# Altium footprint library con-samtec.PCBLIB: 805 footprints (part 53 of 55)
Each footprint in its own frame and in the unit in brackets; x right, y up, seen from the top. Pads: shape width x height; smd on the part's side, far side on the other; paste and mask are expansions set on the pad; w line width, h text height; cw(c..) or ccw(c..) is an arc to the next point about the centre after c.
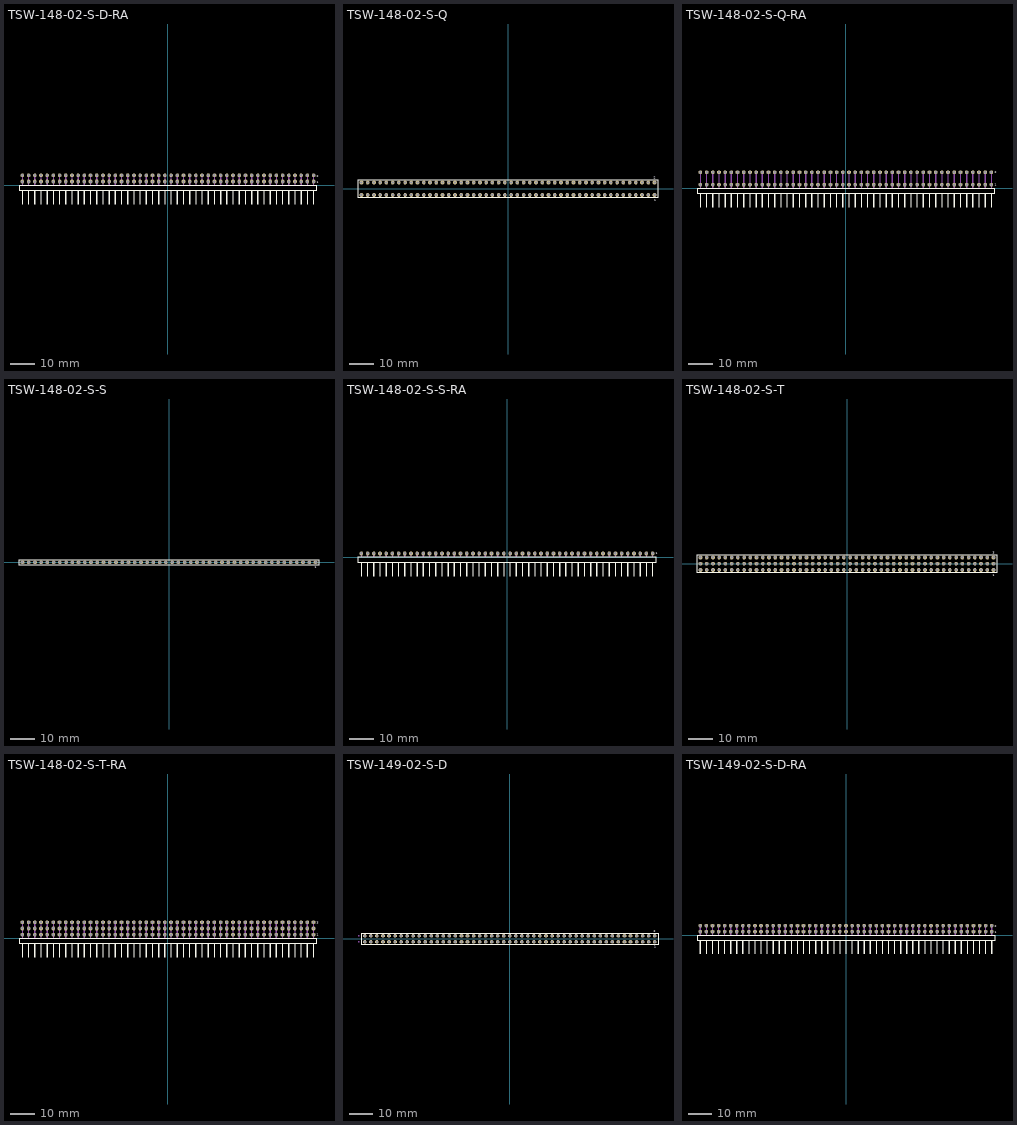
[diagram p52: the footprints below, top view; thin cyan lines are the x and y axes]

## TSW-148-02-S-D-RA [mil]
pads (96):
  oct 59.06x59.06 hole 39.37: 1(2350,60) 2(2350,160) 3(2250,60) 4(2250,160) 5(2150,60) 6(2150,160) 7(2050,60) 8(2050,160) 9(1950,60) 10(1950,160) 11(1850,60) 12(1850,160) 13(1750,60) 14(1750,160) 15(1650,60) 16(1650,160) 17(1550,60) 18(1550,160) 19(1450,60) 20(1450,160) 21(1350,60) 22(1350,160) 23(1250,60) 24(1250,160) 25(1150,60) 26(1150,160) 27(1050,60) 28(1050,160) 29(950,60) 30(950,160) 31(850,60) 32(850,160) 33(750,60) 34(750,160) 35(650,60) 36(650,160) 37(550,60) 38(550,160) 39(450,60) 40(450,160) 41(350,60) 42(350,160) 43(250,60) 44(250,160) 45(150,60) 46(150,160) 47(50,60) 48(50,160) 49(-50,60) 50(-50,160) 51(-150,60) 52(-150,160) 53(-250,60) 54(-250,160) 55(-350,60) 56(-350,160) 57(-450,60) 58(-450,160) 59(-550,60) 60(-550,160) 61(-650,60) 62(-650,160) 63(-750,60) 64(-750,160) 65(-850,60) 66(-850,160) 67(-950,60) 68(-950,160) 69(-1050,60) 70(-1050,160) 71(-1150,60) 72(-1150,160) 73(-1250,60) 74(-1250,160) 75(-1350,60) 76(-1350,160) 77(-1450,60) 78(-1450,160) 79(-1550,60) 80(-1550,160) 81(-1650,60) 82(-1650,160) 83(-1750,60) 84(-1750,160) 85(-1850,60) 86(-1850,160) 87(-1950,60) 88(-1950,160) 89(-2050,60) 90(-2050,160) 91(-2150,60) 92(-2150,160) 93(-2250,60) 94(-2250,160) 95(-2350,60) 96(-2350,160)
Top Overlay:
  rectangle: -2360,-310.63 -2340,-80.32
  rectangle: -2260,-310.63 -2240,-80.32
  rectangle: -2160,-310.63 -2140,-80.32
  rectangle: -2060,-310.63 -2040,-80.32
  rectangle: -1960,-310.63 -1940,-80.32
  rectangle: -1860,-310.63 -1840,-80.32
  rectangle: -1760,-310.63 -1740,-80.32
  rectangle: -1660,-310.63 -1640,-80.32
  rectangle: -1560,-310.63 -1540,-80.32
  rectangle: -1460,-310.63 -1440,-80.32
  rectangle: -1360,-310.63 -1340,-80.32
  rectangle: -1260,-310.63 -1240,-80.32
  rectangle: -1160,-310.63 -1140,-80.32
  rectangle: -1060,-310.63 -1040,-80.32
  rectangle: -960,-310.63 -940,-80.32
  rectangle: -860,-310.63 -840,-80.32
  rectangle: -760,-310.63 -740,-80.32
  rectangle: -660,-310.63 -640,-80.32
  rectangle: -560,-310.63 -540,-80.32
  rectangle: -460,-310.63 -440,-80.32
  rectangle: -360,-310.63 -340,-80.32
  rectangle: -260,-310.63 -240,-80.32
  rectangle: -160,-310.63 -140,-80.32
  rectangle: -60,-310.63 -40,-80.32
  rectangle: 40,-310.63 60,-80.32
  rectangle: 140,-310.63 160,-80.32
  rectangle: 240,-310.63 260,-80.32
  rectangle: 340,-310.63 360,-80.32
  rectangle: 440,-310.63 460,-80.32
  rectangle: 540,-310.63 560,-80.32
  rectangle: 640,-310.63 660,-80.32
  rectangle: 740,-310.63 760,-80.32
  rectangle: 840,-310.63 860,-80.32
  rectangle: 940,-310.63 960,-80.32
  rectangle: 1040,-310.63 1060,-80.32
  rectangle: 1140,-310.63 1160,-80.32
  rectangle: 1240,-310.63 1260,-80.32
  rectangle: 1340,-310.63 1360,-80.32
  rectangle: 1440,-310.63 1460,-80.32
  rectangle: 1540,-310.63 1560,-80.32
  rectangle: 1640,-310.63 1660,-80.32
  rectangle: 1740,-310.63 1760,-80.32
  rectangle: 1840,-310.63 1860,-80.32
  rectangle: 1940,-310.63 1960,-80.32
  rectangle: 2040,-310.63 2060,-80.32
  rectangle: 2140,-310.63 2160,-80.32
  rectangle: 2240,-310.63 2260,-80.32
  rectangle: 2340,-310.63 2360,-80.32
  lines w8: -2405.08,-80.55 2405.08,-80.55 2405.08,-4.17 -2405.08,-4.17 -2405.08,-80.55
  text "1" at 2400.59,30.51 h36.81
  text "2" at 2399.21,129.53 h36.81
Mechanical 16:
  rectangle: -2360,0 -2340,170
  rectangle: -2260,0 -2240,170
  rectangle: -2160,0 -2140,170
  rectangle: -2060,0 -2040,170
  rectangle: -1960,0 -1940,170
  rectangle: -1860,0 -1840,170
  rectangle: -1760,0 -1740,170
  rectangle: -1660,0 -1640,170
  rectangle: -1560,0 -1540,170
  rectangle: -1460,0 -1440,170
  rectangle: -1360,0 -1340,170
  rectangle: -1260,0 -1240,170
  rectangle: -1160,0 -1140,170
  rectangle: -1060,0 -1040,170
  rectangle: -960,0 -940,170
  rectangle: -860,0 -840,170
  rectangle: -760,0 -740,170
  rectangle: -660,0 -640,170
  rectangle: -560,0 -540,170
  rectangle: -460,0 -440,170
  rectangle: -360,0 -340,170
  rectangle: -260,0 -240,170
  rectangle: -160,0 -140,170
  rectangle: -60,0 -40,170
  rectangle: 40,0 60,170
  rectangle: 140,0 160,170
  rectangle: 240,0 260,170
  rectangle: 340,0 360,170
  rectangle: 440,0 460,170
  rectangle: 540,0 560,170
  rectangle: 640,0 660,170
  rectangle: 740,0 760,170
  rectangle: 840,0 860,170
  rectangle: 940,0 960,170
  rectangle: 1040,0 1060,170
  rectangle: 1140,0 1160,170
  rectangle: 1240,0 1260,170
  rectangle: 1340,0 1360,170
  rectangle: 1440,0 1460,170
  rectangle: 1540,0 1560,170
  rectangle: 1640,0 1660,170
  rectangle: 1740,0 1760,170
  rectangle: 1840,0 1860,170
  rectangle: 1940,0 1960,170
  rectangle: 2040,0 2060,170
  rectangle: 2140,0 2160,170
  rectangle: 2240,0 2260,170
  rectangle: 2340,0 2360,170

## TSW-148-02-S-Q [mm]
pads (96):
  oct 1.5x1.5 hole 1: 1(59.69,-2.54) 2(59.69,2.54) 3(57.15,-2.54) 4(57.15,2.54) 5(54.61,-2.54) 6(54.61,2.54) 7(52.07,-2.54) 8(52.07,2.54) 9(49.53,-2.54) 10(49.53,2.54) 11(46.99,-2.54) 12(46.99,2.54) 13(44.45,-2.54) 14(44.45,2.54) 15(41.91,-2.54) 16(41.91,2.54) 17(39.37,-2.54) 18(39.37,2.54) 19(36.83,-2.54) 20(36.83,2.54) 21(34.29,-2.54) 22(34.29,2.54) 23(31.75,-2.54) 24(31.75,2.54) 25(29.21,-2.54) 26(29.21,2.54) 27(26.67,-2.54) 28(26.67,2.54) 29(24.13,-2.54) 30(24.13,2.54) 31(21.59,-2.54) 32(21.59,2.54) 33(19.05,-2.54) 34(19.05,2.54) 35(16.51,-2.54) 36(16.51,2.54) 37(13.97,-2.54) 38(13.97,2.54) 39(11.43,-2.54) 40(11.43,2.54) 41(8.89,-2.54) 42(8.89,2.54) 43(6.35,-2.54) 44(6.35,2.54) 45(3.81,-2.54) 46(3.81,2.54) 47(1.27,-2.54) 48(1.27,2.54) 49(-1.27,-2.54) 50(-1.27,2.54) 51(-3.81,-2.54) 52(-3.81,2.54) 53(-6.35,-2.54) 54(-6.35,2.54) 55(-8.89,-2.54) 56(-8.89,2.54) 57(-11.43,-2.54) 58(-11.43,2.54) 59(-13.97,-2.54) 60(-13.97,2.54) 61(-16.51,-2.54) 62(-16.51,2.54) 63(-19.05,-2.54) 64(-19.05,2.54) 65(-21.59,-2.54) 66(-21.59,2.54) 67(-24.13,-2.54) 68(-24.13,2.54) 69(-26.67,-2.54) 70(-26.67,2.54) 71(-29.21,-2.54) 72(-29.21,2.54) 73(-31.75,-2.54) 74(-31.75,2.54) 75(-34.29,-2.54) 76(-34.29,2.54) 77(-36.83,-2.54) 78(-36.83,2.54) 79(-39.37,-2.54) 80(-39.37,2.54) 81(-41.91,-2.54) 82(-41.91,2.54) 83(-44.45,-2.54) 84(-44.45,2.54) 85(-46.99,-2.54) 86(-46.99,2.54) 87(-49.53,-2.54) 88(-49.53,2.54) 89(-52.07,-2.54) 90(-52.07,2.54) 91(-54.61,-2.54) 92(-54.61,2.54) 93(-57.15,-2.54) 94(-57.15,2.54) 95(-59.69,-2.54) 96(-59.69,2.54)
Top Overlay:
  lines w0.203: -61.089,-3.695 61.089,-3.695 61.089,3.695 -61.089,3.695 -61.089,-3.695
  text "1" at 59.532,-5.138 h0.94
  text "2" at 59.432,3.989 h0.94
Mechanical 16:
  rectangle: -60.04,-2.89 -59.34,-2.19
  rectangle: -60.04,2.19 -59.34,2.89
  rectangle: -57.5,-2.89 -56.8,-2.19
  rectangle: -57.5,2.19 -56.8,2.89
  rectangle: -54.96,-2.89 -54.26,-2.19
  rectangle: -54.96,2.19 -54.26,2.89
  rectangle: -52.42,-2.89 -51.72,-2.19
  rectangle: -52.42,2.19 -51.72,2.89
  rectangle: -49.88,-2.89 -49.18,-2.19
  rectangle: -49.88,2.19 -49.18,2.89
  rectangle: -47.34,-2.89 -46.64,-2.19
  rectangle: -47.34,2.19 -46.64,2.89
  rectangle: -44.8,-2.89 -44.1,-2.19
  rectangle: -44.8,2.19 -44.1,2.89
  rectangle: -42.26,-2.89 -41.56,-2.19
  rectangle: -42.26,2.19 -41.56,2.89
  rectangle: -39.72,-2.89 -39.02,-2.19
  rectangle: -39.72,2.19 -39.02,2.89
  rectangle: -37.18,-2.89 -36.48,-2.19
  rectangle: -37.18,2.19 -36.48,2.89
  rectangle: -34.64,-2.89 -33.94,-2.19
  rectangle: -34.64,2.19 -33.94,2.89
  rectangle: -32.1,-2.89 -31.4,-2.19
  rectangle: -32.1,2.19 -31.4,2.89
  rectangle: -29.56,-2.89 -28.86,-2.19
  rectangle: -29.56,2.19 -28.86,2.89
  rectangle: -27.02,-2.89 -26.32,-2.19
  rectangle: -27.02,2.19 -26.32,2.89
  rectangle: -24.48,-2.89 -23.78,-2.19
  rectangle: -24.48,2.19 -23.78,2.89
  rectangle: -21.94,-2.89 -21.24,-2.19
  rectangle: -21.94,2.19 -21.24,2.89
  rectangle: -19.4,-2.89 -18.7,-2.19
  rectangle: -19.4,2.19 -18.7,2.89
  rectangle: -16.86,-2.89 -16.16,-2.19
  rectangle: -16.86,2.19 -16.16,2.89
  rectangle: -14.32,-2.89 -13.62,-2.19
  rectangle: -14.32,2.19 -13.62,2.89
  rectangle: -11.78,-2.89 -11.08,-2.19
  rectangle: -11.78,2.19 -11.08,2.89
  rectangle: -9.24,-2.89 -8.54,-2.19
  rectangle: -9.24,2.19 -8.54,2.89
  rectangle: -6.7,-2.89 -6,-2.19
  rectangle: -6.7,2.19 -6,2.89
  rectangle: -4.16,-2.89 -3.46,-2.19
  rectangle: -4.16,2.19 -3.46,2.89
  rectangle: -1.62,-2.89 -0.92,-2.19
  rectangle: -1.62,2.19 -0.92,2.89
  rectangle: 0.92,-2.89 1.62,-2.19
  rectangle: 0.92,2.19 1.62,2.89
  rectangle: 3.46,-2.89 4.16,-2.19
  rectangle: 3.46,2.19 4.16,2.89
  rectangle: 6,-2.89 6.7,-2.19
  rectangle: 6,2.19 6.7,2.89
  rectangle: 8.54,-2.89 9.24,-2.19
  rectangle: 8.54,2.19 9.24,2.89
  rectangle: 11.08,-2.89 11.78,-2.19
  rectangle: 11.08,2.19 11.78,2.89
  rectangle: 13.62,-2.89 14.32,-2.19
  rectangle: 13.62,2.19 14.32,2.89
  rectangle: 16.16,-2.89 16.86,-2.19
  rectangle: 16.16,2.19 16.86,2.89
  rectangle: 18.7,-2.89 19.4,-2.19
  rectangle: 18.7,2.19 19.4,2.89
  rectangle: 21.24,-2.89 21.94,-2.19
  rectangle: 21.24,2.19 21.94,2.89
  rectangle: 23.78,-2.89 24.48,-2.19
  rectangle: 23.78,2.19 24.48,2.89
  rectangle: 26.32,-2.89 27.02,-2.19
  rectangle: 26.32,2.19 27.02,2.89
  rectangle: 28.86,-2.89 29.56,-2.19
  rectangle: 28.86,2.19 29.56,2.89
  rectangle: 31.4,-2.89 32.1,-2.19
  rectangle: 31.4,2.19 32.1,2.89
  rectangle: 33.94,-2.89 34.64,-2.19
  rectangle: 33.94,2.19 34.64,2.89
  rectangle: 36.48,-2.89 37.18,-2.19
  rectangle: 36.48,2.19 37.18,2.89
  rectangle: 39.02,-2.89 39.72,-2.19
  rectangle: 39.02,2.19 39.72,2.89
  rectangle: 41.56,-2.89 42.26,-2.19
  rectangle: 41.56,2.19 42.26,2.89
  rectangle: 44.1,-2.89 44.8,-2.19
  rectangle: 44.1,2.19 44.8,2.89
  rectangle: 46.64,-2.89 47.34,-2.19
  rectangle: 46.64,2.19 47.34,2.89
  rectangle: 49.18,-2.89 49.88,-2.19
  rectangle: 49.18,2.19 49.88,2.89
  rectangle: 51.72,-2.89 52.42,-2.19
  rectangle: 51.72,2.19 52.42,2.89
  rectangle: 54.26,-2.89 54.96,-2.19
  rectangle: 54.26,2.19 54.96,2.89
  rectangle: 56.8,-2.89 57.5,-2.19
  rectangle: 56.8,2.19 57.5,2.89
  rectangle: 59.34,-2.89 60.04,-2.19
  rectangle: 59.34,2.19 60.04,2.89

## TSW-148-02-S-Q-RA [mil]
pads (96):
  oct 59.06x59.06 hole 39.37: 1(2350,60) 2(2350,260) 3(2250,60) 4(2250,260) 5(2150,60) 6(2150,260) 7(2050,60) 8(2050,260) 9(1950,60) 10(1950,260) 11(1850,60) 12(1850,260) 13(1750,60) 14(1750,260) 15(1650,60) 16(1650,260) 17(1550,60) 18(1550,260) 19(1450,60) 20(1450,260) 21(1350,60) 22(1350,260) 23(1250,60) 24(1250,260) 25(1150,60) 26(1150,260) 27(1050,60) 28(1050,260) 29(950,60) 30(950,260) 31(850,60) 32(850,260) 33(750,60) 34(750,260) 35(650,60) 36(650,260) 37(550,60) 38(550,260) 39(450,60) 40(450,260) 41(350,60) 42(350,260) 43(250,60) 44(250,260) 45(150,60) 46(150,260) 47(50,60) 48(50,260) 49(-50,60) 50(-50,260) 51(-150,60) 52(-150,260) 53(-250,60) 54(-250,260) 55(-350,60) 56(-350,260) 57(-450,60) 58(-450,260) 59(-550,60) 60(-550,260) 61(-650,60) 62(-650,260) 63(-750,60) 64(-750,260) 65(-850,60) 66(-850,260) 67(-950,60) 68(-950,260) 69(-1050,60) 70(-1050,260) 71(-1150,60) 72(-1150,260) 73(-1250,60) 74(-1250,260) 75(-1350,60) 76(-1350,260) 77(-1450,60) 78(-1450,260) 79(-1550,60) 80(-1550,260) 81(-1650,60) 82(-1650,260) 83(-1750,60) 84(-1750,260) 85(-1850,60) 86(-1850,260) 87(-1950,60) 88(-1950,260) 89(-2050,60) 90(-2050,260) 91(-2150,60) 92(-2150,260) 93(-2250,60) 94(-2250,260) 95(-2350,60) 96(-2350,260)
Top Overlay:
  rectangle: -2360,-310.63 -2340,-80.32
  rectangle: -2260,-310.63 -2240,-80.32
  rectangle: -2160,-310.63 -2140,-80.32
  rectangle: -2060,-310.63 -2040,-80.32
  rectangle: -1960,-310.63 -1940,-80.32
  rectangle: -1860,-310.63 -1840,-80.32
  rectangle: -1760,-310.63 -1740,-80.32
  rectangle: -1660,-310.63 -1640,-80.32
  rectangle: -1560,-310.63 -1540,-80.32
  rectangle: -1460,-310.63 -1440,-80.32
  rectangle: -1360,-310.63 -1340,-80.32
  rectangle: -1260,-310.63 -1240,-80.32
  rectangle: -1160,-310.63 -1140,-80.32
  rectangle: -1060,-310.63 -1040,-80.32
  rectangle: -960,-310.63 -940,-80.32
  rectangle: -860,-310.63 -840,-80.32
  rectangle: -760,-310.63 -740,-80.32
  rectangle: -660,-310.63 -640,-80.32
  rectangle: -560,-310.63 -540,-80.32
  rectangle: -460,-310.63 -440,-80.32
  rectangle: -360,-310.63 -340,-80.32
  rectangle: -260,-310.63 -240,-80.32
  rectangle: -160,-310.63 -140,-80.32
  rectangle: -60,-310.63 -40,-80.32
  rectangle: 40,-310.63 60,-80.32
  rectangle: 140,-310.63 160,-80.32
  rectangle: 240,-310.63 260,-80.32
  rectangle: 340,-310.63 360,-80.32
  rectangle: 440,-310.63 460,-80.32
  rectangle: 540,-310.63 560,-80.32
  rectangle: 640,-310.63 660,-80.32
  rectangle: 740,-310.63 760,-80.32
  rectangle: 840,-310.63 860,-80.32
  rectangle: 940,-310.63 960,-80.32
  rectangle: 1040,-310.63 1060,-80.32
  rectangle: 1140,-310.63 1160,-80.32
  rectangle: 1240,-310.63 1260,-80.32
  rectangle: 1340,-310.63 1360,-80.32
  rectangle: 1440,-310.63 1460,-80.32
  rectangle: 1540,-310.63 1560,-80.32
  rectangle: 1640,-310.63 1660,-80.32
  rectangle: 1740,-310.63 1760,-80.32
  rectangle: 1840,-310.63 1860,-80.32
  rectangle: 1940,-310.63 1960,-80.32
  rectangle: 2040,-310.63 2060,-80.32
  rectangle: 2140,-310.63 2160,-80.32
  rectangle: 2240,-310.63 2260,-80.32
  rectangle: 2340,-310.63 2360,-80.32
  lines w8: -2405.08,-80.55 2405.08,-80.55 2405.08,-4.17 -2405.08,-4.17 -2405.08,-80.55
  text "1" at 2403.54,43.31 h36.81
  text "2" at 2401.18,242.72 h36.81
Mechanical 16:
  rectangle: -2360,0 -2340,270
  rectangle: -2260,0 -2240,270
  rectangle: -2160,0 -2140,270
  rectangle: -2060,0 -2040,270
  rectangle: -1960,0 -1940,270
  rectangle: -1860,0 -1840,270
  rectangle: -1760,0 -1740,270
  rectangle: -1660,0 -1640,270
  rectangle: -1560,0 -1540,270
  rectangle: -1460,0 -1440,270
  rectangle: -1360,0 -1340,270
  rectangle: -1260,0 -1240,270
  rectangle: -1160,0 -1140,270
  rectangle: -1060,0 -1040,270
  rectangle: -960,0 -940,270
  rectangle: -860,0 -840,270
  rectangle: -760,0 -740,270
  rectangle: -660,0 -640,270
  rectangle: -560,0 -540,270
  rectangle: -460,0 -440,270
  rectangle: -360,0 -340,270
  rectangle: -260,0 -240,270
  rectangle: -160,0 -140,270
  rectangle: -60,0 -40,270
  rectangle: 40,0 60,270
  rectangle: 140,0 160,270
  rectangle: 240,0 260,270
  rectangle: 340,0 360,270
  rectangle: 440,0 460,270
  rectangle: 540,0 560,270
  rectangle: 640,0 660,270
  rectangle: 740,0 760,270
  rectangle: 840,0 860,270
  rectangle: 940,0 960,270
  rectangle: 1040,0 1060,270
  rectangle: 1140,0 1160,270
  rectangle: 1240,0 1260,270
  rectangle: 1340,0 1360,270
  rectangle: 1440,0 1460,270
  rectangle: 1540,0 1560,270
  rectangle: 1640,0 1660,270
  rectangle: 1740,0 1760,270
  rectangle: 1840,0 1860,270
  rectangle: 1940,0 1960,270
  rectangle: 2040,0 2060,270
  rectangle: 2140,0 2160,270
  rectangle: 2240,0 2260,270
  rectangle: 2340,0 2360,270

## TSW-148-02-S-S [mm]
pads (48):
  oct 1.5x1.5 hole 1: 1(59.69,0) 2(57.15,0) 3(54.61,0) 4(52.07,0) 5(49.53,0) 6(46.99,0) 7(44.45,0) 8(41.91,0) 9(39.37,0) 10(36.83,0) 11(34.29,0) 12(31.75,0) 13(29.21,0) 14(26.67,0) 15(24.13,0) 16(21.59,0) 17(19.05,0) 18(16.51,0) 19(13.97,0) 20(11.43,0) 21(8.89,0) 22(6.35,0) 23(3.81,0) 24(1.27,0) 25(-1.27,0) 26(-3.81,0) 27(-6.35,0) 28(-8.89,0) 29(-11.43,0) 30(-13.97,0) 31(-16.51,0) 32(-19.05,0) 33(-21.59,0) 34(-24.13,0) 35(-26.67,0) 36(-29.21,0) 37(-31.75,0) 38(-34.29,0) 39(-36.83,0) 40(-39.37,0) 41(-41.91,0) 42(-44.45,0) 43(-46.99,0) 44(-49.53,0) 45(-52.07,0) 46(-54.61,0) 47(-57.15,0) 48(-59.69,0)
Top Overlay:
  lines w0.203: -61.089,-1.155 61.089,-1.155 61.089,1.155 -61.089,1.155 -61.089,-1.155
  text "1" at 59.432,-2.498 h0.94
Mechanical 16:
  rectangle: -60.04,-0.35 -59.34,0.35
  rectangle: -57.5,-0.35 -56.8,0.35
  rectangle: -54.96,-0.35 -54.26,0.35
  rectangle: -52.42,-0.35 -51.72,0.35
  rectangle: -49.88,-0.35 -49.18,0.35
  rectangle: -47.34,-0.35 -46.64,0.35
  rectangle: -44.8,-0.35 -44.1,0.35
  rectangle: -42.26,-0.35 -41.56,0.35
  rectangle: -39.72,-0.35 -39.02,0.35
  rectangle: -37.18,-0.35 -36.48,0.35
  rectangle: -34.64,-0.35 -33.94,0.35
  rectangle: -32.1,-0.35 -31.4,0.35
  rectangle: -29.56,-0.35 -28.86,0.35
  rectangle: -27.02,-0.35 -26.32,0.35
  rectangle: -24.48,-0.35 -23.78,0.35
  rectangle: -21.94,-0.35 -21.24,0.35
  rectangle: -19.4,-0.35 -18.7,0.35
  rectangle: -16.86,-0.35 -16.16,0.35
  rectangle: -14.32,-0.35 -13.62,0.35
  rectangle: -11.78,-0.35 -11.08,0.35
  rectangle: -9.24,-0.35 -8.54,0.35
  rectangle: -6.7,-0.35 -6,0.35
  rectangle: -4.16,-0.35 -3.46,0.35
  rectangle: -1.62,-0.35 -0.92,0.35
  rectangle: 0.92,-0.35 1.62,0.35
  rectangle: 3.46,-0.35 4.16,0.35
  rectangle: 6,-0.35 6.7,0.35
  rectangle: 8.54,-0.35 9.24,0.35
  rectangle: 11.08,-0.35 11.78,0.35
  rectangle: 13.62,-0.35 14.32,0.35
  rectangle: 16.16,-0.35 16.86,0.35
  rectangle: 18.7,-0.35 19.4,0.35
  rectangle: 21.24,-0.35 21.94,0.35
  rectangle: 23.78,-0.35 24.48,0.35
  rectangle: 26.32,-0.35 27.02,0.35
  rectangle: 28.86,-0.35 29.56,0.35
  rectangle: 31.4,-0.35 32.1,0.35
  rectangle: 33.94,-0.35 34.64,0.35
  rectangle: 36.48,-0.35 37.18,0.35
  rectangle: 39.02,-0.35 39.72,0.35
  rectangle: 41.56,-0.35 42.26,0.35
  rectangle: 44.1,-0.35 44.8,0.35
  rectangle: 46.64,-0.35 47.34,0.35
  rectangle: 49.18,-0.35 49.88,0.35
  rectangle: 51.72,-0.35 52.42,0.35
  rectangle: 54.26,-0.35 54.96,0.35
  rectangle: 56.8,-0.35 57.5,0.35
  rectangle: 59.34,-0.35 60.04,0.35

## TSW-148-02-S-S-RA [mil]
pads (48):
  oct 59.06x59.06 hole 39.37: 1(2350,60) 2(2250,60) 3(2150,60) 4(2050,60) 5(1950,60) 6(1850,60) 7(1750,60) 8(1650,60) 9(1550,60) 10(1450,60) 11(1350,60) 12(1250,60) 13(1150,60) 14(1050,60) 15(950,60) 16(850,60) 17(750,60) 18(650,60) 19(550,60) 20(450,60) 21(350,60) 22(250,60) 23(150,60) 24(50,60) 25(-50,60) 26(-150,60) 27(-250,60) 28(-350,60) 29(-450,60) 30(-550,60) 31(-650,60) 32(-750,60) 33(-850,60) 34(-950,60) 35(-1050,60) 36(-1150,60) 37(-1250,60) 38(-1350,60) 39(-1450,60) 40(-1550,60) 41(-1650,60) 42(-1750,60) 43(-1850,60) 44(-1950,60) 45(-2050,60) 46(-2150,60) 47(-2250,60) 48(-2350,60)
Top Overlay:
  rectangle: -2360,-310.63 -2340,-80.32
  rectangle: -2260,-310.63 -2240,-80.32
  rectangle: -2160,-310.63 -2140,-80.32
  rectangle: -2060,-310.63 -2040,-80.32
  rectangle: -1960,-310.63 -1940,-80.32
  rectangle: -1860,-310.63 -1840,-80.32
  rectangle: -1760,-310.63 -1740,-80.32
  rectangle: -1660,-310.63 -1640,-80.32
  rectangle: -1560,-310.63 -1540,-80.32
  rectangle: -1460,-310.63 -1440,-80.32
  rectangle: -1360,-310.63 -1340,-80.32
  rectangle: -1260,-310.63 -1240,-80.32
  rectangle: -1160,-310.63 -1140,-80.32
  rectangle: -1060,-310.63 -1040,-80.32
  rectangle: -960,-310.63 -940,-80.32
  rectangle: -860,-310.63 -840,-80.32
  rectangle: -760,-310.63 -740,-80.32
  rectangle: -660,-310.63 -640,-80.32
  rectangle: -560,-310.63 -540,-80.32
  rectangle: -460,-310.63 -440,-80.32
  rectangle: -360,-310.63 -340,-80.32
  rectangle: -260,-310.63 -240,-80.32
  rectangle: -160,-310.63 -140,-80.32
  rectangle: -60,-310.63 -40,-80.32
  rectangle: 40,-310.63 60,-80.32
  rectangle: 140,-310.63 160,-80.32
  rectangle: 240,-310.63 260,-80.32
  rectangle: 340,-310.63 360,-80.32
  rectangle: 440,-310.63 460,-80.32
  rectangle: 540,-310.63 560,-80.32
  rectangle: 640,-310.63 660,-80.32
  rectangle: 740,-310.63 760,-80.32
  rectangle: 840,-310.63 860,-80.32
  rectangle: 940,-310.63 960,-80.32
  rectangle: 1040,-310.63 1060,-80.32
  rectangle: 1140,-310.63 1160,-80.32
  rectangle: 1240,-310.63 1260,-80.32
  rectangle: 1340,-310.63 1360,-80.32
  rectangle: 1440,-310.63 1460,-80.32
  rectangle: 1540,-310.63 1560,-80.32
  rectangle: 1640,-310.63 1660,-80.32
  rectangle: 1740,-310.63 1760,-80.32
  rectangle: 1840,-310.63 1860,-80.32
  rectangle: 1940,-310.63 1960,-80.32
  rectangle: 2040,-310.63 2060,-80.32
  rectangle: 2140,-310.63 2160,-80.32
  rectangle: 2240,-310.63 2260,-80.32
  rectangle: 2340,-310.63 2360,-80.32
  lines w8: -2405.08,-80.55 2405.08,-80.55 2405.08,-4.17 -2405.08,-4.17 -2405.08,-80.55
  text "1" at 2400.47,45.35 h36.81
Mechanical 16:
  rectangle: -2360,0 -2340,70
  rectangle: -2260,0 -2240,70
  rectangle: -2160,0 -2140,70
  rectangle: -2060,0 -2040,70
  rectangle: -1960,0 -1940,70
  rectangle: -1860,0 -1840,70
  rectangle: -1760,0 -1740,70
  rectangle: -1660,0 -1640,70
  rectangle: -1560,0 -1540,70
  rectangle: -1460,0 -1440,70
  rectangle: -1360,0 -1340,70
  rectangle: -1260,0 -1240,70
  rectangle: -1160,0 -1140,70
  rectangle: -1060,0 -1040,70
  rectangle: -960,0 -940,70
  rectangle: -860,0 -840,70
  rectangle: -760,0 -740,70
  rectangle: -660,0 -640,70
  rectangle: -560,0 -540,70
  rectangle: -460,0 -440,70
  rectangle: -360,0 -340,70
  rectangle: -260,0 -240,70
  rectangle: -160,0 -140,70
  rectangle: -60,0 -40,70
  rectangle: 40,0 60,70
  rectangle: 140,0 160,70
  rectangle: 240,0 260,70
  rectangle: 340,0 360,70
  rectangle: 440,0 460,70
  rectangle: 540,0 560,70
  rectangle: 640,0 660,70
  rectangle: 740,0 760,70
  rectangle: 840,0 860,70
  rectangle: 940,0 960,70
  rectangle: 1040,0 1060,70
  rectangle: 1140,0 1160,70
  rectangle: 1240,0 1260,70
  rectangle: 1340,0 1360,70
  rectangle: 1440,0 1460,70
  rectangle: 1540,0 1560,70
  rectangle: 1640,0 1660,70
  rectangle: 1740,0 1760,70
  rectangle: 1840,0 1860,70
  rectangle: 1940,0 1960,70
  rectangle: 2040,0 2060,70
  rectangle: 2140,0 2160,70
  rectangle: 2240,0 2260,70
  rectangle: 2340,0 2360,70

## TSW-148-02-S-T [mm]
pads (144):
  oct 1.5x1.5 hole 1: 1(59.69,-2.54) 2(59.69,0) 3(59.69,2.54) 4(57.15,-2.54) 5(57.15,0) 6(57.15,2.54) 7(54.61,-2.54) 8(54.61,0) 9(54.61,2.54) 10(52.07,-2.54) 11(52.07,0) 12(52.07,2.54) 13(49.53,-2.54) 14(49.53,0) 15(49.53,2.54) 16(46.99,-2.54) 17(46.99,0) 18(46.99,2.54) 19(44.45,-2.54) 20(44.45,0) 21(44.45,2.54) 22(41.91,-2.54) 23(41.91,0) 24(41.91,2.54) 25(39.37,-2.54) 26(39.37,0) 27(39.37,2.54) 28(36.83,-2.54) 29(36.83,0) 30(36.83,2.54) 31(34.29,-2.54) 32(34.29,0) 33(34.29,2.54) 34(31.75,-2.54) 35(31.75,0) 36(31.75,2.54) 37(29.21,-2.54) 38(29.21,0) 39(29.21,2.54) 40(26.67,-2.54) 41(26.67,0) 42(26.67,2.54) 43(24.13,-2.54) 44(24.13,0) 45(24.13,2.54) 46(21.59,-2.54) 47(21.59,0) 48(21.59,2.54) 49(19.05,-2.54) 50(19.05,0) 51(19.05,2.54) 52(16.51,-2.54) 53(16.51,0) 54(16.51,2.54) 55(13.97,-2.54) 56(13.97,0) 57(13.97,2.54) 58(11.43,-2.54) 59(11.43,0) 60(11.43,2.54) 61(8.89,-2.54) 62(8.89,0) 63(8.89,2.54) 64(6.35,-2.54) 65(6.35,0) 66(6.35,2.54) 67(3.81,-2.54) 68(3.81,0) 69(3.81,2.54) 70(1.27,-2.54) 71(1.27,0) 72(1.27,2.54) 73(-1.27,-2.54) 74(-1.27,0) 75(-1.27,2.54) 76(-3.81,-2.54) 77(-3.81,0) 78(-3.81,2.54) 79(-6.35,-2.54) 80(-6.35,0) 81(-6.35,2.54) 82(-8.89,-2.54) 83(-8.89,0) 84(-8.89,2.54) 85(-11.43,-2.54) 86(-11.43,0) 87(-11.43,2.54) 88(-13.97,-2.54) 89(-13.97,0) 90(-13.97,2.54) 91(-16.51,-2.54) 92(-16.51,0) 93(-16.51,2.54) 94(-19.05,-2.54) 95(-19.05,0) 96(-19.05,2.54) 97(-21.59,-2.54) 98(-21.59,0) 99(-21.59,2.54) 100(-24.13,-2.54) 101(-24.13,0) 102(-24.13,2.54) 103(-26.67,-2.54) 104(-26.67,0) 105(-26.67,2.54) 106(-29.21,-2.54) 107(-29.21,0) 108(-29.21,2.54) 109(-31.75,-2.54) 110(-31.75,0) 111(-31.75,2.54) 112(-34.29,-2.54) 113(-34.29,0) 114(-34.29,2.54) 115(-36.83,-2.54) 116(-36.83,0) 117(-36.83,2.54) 118(-39.37,-2.54) 119(-39.37,0) 120(-39.37,2.54) 121(-41.91,-2.54) 122(-41.91,0) 123(-41.91,2.54) 124(-44.45,-2.54) 125(-44.45,0) 126(-44.45,2.54) 127(-46.99,-2.54) 128(-46.99,0) 129(-46.99,2.54) 130(-49.53,-2.54) 131(-49.53,0) 132(-49.53,2.54) 133(-52.07,-2.54) 134(-52.07,0) 135(-52.07,2.54) 136(-54.61,-2.54) 137(-54.61,0) 138(-54.61,2.54) 139(-57.15,-2.54) 140(-57.15,0) 141(-57.15,2.54) 142(-59.69,-2.54) 143(-59.69,0) 144(-59.69,2.54)
Top Overlay:
  lines w0.203: -61.089,-3.695 61.089,-3.695 61.089,3.695 -61.089,3.695 -61.089,-3.695
  text "1" at 59.382,-5.188 h0.94
  text "3" at 59.378,3.989 h0.94
Mechanical 16:
  rectangle: -60.04,-2.89 -59.34,-2.19
  rectangle: -60.04,-0.35 -59.34,0.35
  rectangle: -60.04,2.19 -59.34,2.89
  rectangle: -57.5,-2.89 -56.8,-2.19
  rectangle: -57.5,-0.35 -56.8,0.35
  rectangle: -57.5,2.19 -56.8,2.89
  rectangle: -54.96,-2.89 -54.26,-2.19
  rectangle: -54.96,-0.35 -54.26,0.35
  rectangle: -54.96,2.19 -54.26,2.89
  rectangle: -52.42,-2.89 -51.72,-2.19
  rectangle: -52.42,-0.35 -51.72,0.35
  rectangle: -52.42,2.19 -51.72,2.89
  rectangle: -49.88,-2.89 -49.18,-2.19
  rectangle: -49.88,-0.35 -49.18,0.35
  rectangle: -49.88,2.19 -49.18,2.89
  rectangle: -47.34,-2.89 -46.64,-2.19
  rectangle: -47.34,-0.35 -46.64,0.35
  rectangle: -47.34,2.19 -46.64,2.89
  rectangle: -44.8,-2.89 -44.1,-2.19
  rectangle: -44.8,-0.35 -44.1,0.35
  rectangle: -44.8,2.19 -44.1,2.89
  rectangle: -42.26,-2.89 -41.56,-2.19
  rectangle: -42.26,-0.35 -41.56,0.35
  rectangle: -42.26,2.19 -41.56,2.89
  rectangle: -39.72,-2.89 -39.02,-2.19
  rectangle: -39.72,-0.35 -39.02,0.35
  rectangle: -39.72,2.19 -39.02,2.89
  rectangle: -37.18,-2.89 -36.48,-2.19
  rectangle: -37.18,-0.35 -36.48,0.35
  rectangle: -37.18,2.19 -36.48,2.89
  rectangle: -34.64,-2.89 -33.94,-2.19
  rectangle: -34.64,-0.35 -33.94,0.35
  rectangle: -34.64,2.19 -33.94,2.89
  rectangle: -32.1,-2.89 -31.4,-2.19
  rectangle: -32.1,-0.35 -31.4,0.35
  rectangle: -32.1,2.19 -31.4,2.89
  rectangle: -29.56,-2.89 -28.86,-2.19
  rectangle: -29.56,-0.35 -28.86,0.35
  rectangle: -29.56,2.19 -28.86,2.89
  rectangle: -27.02,-2.89 -26.32,-2.19
  rectangle: -27.02,-0.35 -26.32,0.35
  rectangle: -27.02,2.19 -26.32,2.89
  rectangle: -24.48,-2.89 -23.78,-2.19
  rectangle: -24.48,-0.35 -23.78,0.35
  rectangle: -24.48,2.19 -23.78,2.89
  rectangle: -21.94,-2.89 -21.24,-2.19
  rectangle: -21.94,-0.35 -21.24,0.35
  rectangle: -21.94,2.19 -21.24,2.89
  rectangle: -19.4,-2.89 -18.7,-2.19
  rectangle: -19.4,-0.35 -18.7,0.35
  rectangle: -19.4,2.19 -18.7,2.89
  rectangle: -16.86,-2.89 -16.16,-2.19
  rectangle: -16.86,-0.35 -16.16,0.35
  rectangle: -16.86,2.19 -16.16,2.89
  rectangle: -14.32,-2.89 -13.62,-2.19
  rectangle: -14.32,-0.35 -13.62,0.35
  rectangle: -14.32,2.19 -13.62,2.89
  rectangle: -11.78,-2.89 -11.08,-2.19
  rectangle: -11.78,-0.35 -11.08,0.35
  rectangle: -11.78,2.19 -11.08,2.89
  rectangle: -9.24,-2.89 -8.54,-2.19
  rectangle: -9.24,-0.35 -8.54,0.35
  rectangle: -9.24,2.19 -8.54,2.89
  rectangle: -6.7,-2.89 -6,-2.19
  rectangle: -6.7,-0.35 -6,0.35
  rectangle: -6.7,2.19 -6,2.89
  rectangle: -4.16,-2.89 -3.46,-2.19
  rectangle: -4.16,-0.35 -3.46,0.35
  rectangle: -4.16,2.19 -3.46,2.89
  rectangle: -1.62,-2.89 -0.92,-2.19
  rectangle: -1.62,-0.35 -0.92,0.35
  rectangle: -1.62,2.19 -0.92,2.89
  rectangle: 0.92,-2.89 1.62,-2.19
  rectangle: 0.92,-0.35 1.62,0.35
  rectangle: 0.92,2.19 1.62,2.89
  rectangle: 3.46,-2.89 4.16,-2.19
  rectangle: 3.46,-0.35 4.16,0.35
  rectangle: 3.46,2.19 4.16,2.89
  rectangle: 6,-2.89 6.7,-2.19
  rectangle: 6,-0.35 6.7,0.35
  rectangle: 6,2.19 6.7,2.89
  rectangle: 8.54,-2.89 9.24,-2.19
  rectangle: 8.54,-0.35 9.24,0.35
  rectangle: 8.54,2.19 9.24,2.89
  rectangle: 11.08,-2.89 11.78,-2.19
  rectangle: 11.08,-0.35 11.78,0.35
  rectangle: 11.08,2.19 11.78,2.89
  rectangle: 13.62,-2.89 14.32,-2.19
  rectangle: 13.62,-0.35 14.32,0.35
  rectangle: 13.62,2.19 14.32,2.89
  rectangle: 16.16,-2.89 16.86,-2.19
  rectangle: 16.16,-0.35 16.86,0.35
  rectangle: 16.16,2.19 16.86,2.89
  rectangle: 18.7,-2.89 19.4,-2.19
  rectangle: 18.7,-0.35 19.4,0.35
  rectangle: 18.7,2.19 19.4,2.89
  rectangle: 21.24,-2.89 21.94,-2.19
  rectangle: 21.24,-0.35 21.94,0.35
  rectangle: 21.24,2.19 21.94,2.89
  rectangle: 23.78,-2.89 24.48,-2.19
  rectangle: 23.78,-0.35 24.48,0.35
  rectangle: 23.78,2.19 24.48,2.89
  rectangle: 26.32,-2.89 27.02,-2.19
  rectangle: 26.32,-0.35 27.02,0.35
  rectangle: 26.32,2.19 27.02,2.89
  rectangle: 28.86,-2.89 29.56,-2.19
  rectangle: 28.86,-0.35 29.56,0.35
  rectangle: 28.86,2.19 29.56,2.89
  rectangle: 31.4,-2.89 32.1,-2.19
  rectangle: 31.4,-0.35 32.1,0.35
  rectangle: 31.4,2.19 32.1,2.89
  rectangle: 33.94,-2.89 34.64,-2.19
  rectangle: 33.94,-0.35 34.64,0.35
  rectangle: 33.94,2.19 34.64,2.89
  rectangle: 36.48,-2.89 37.18,-2.19
  rectangle: 36.48,-0.35 37.18,0.35
  rectangle: 36.48,2.19 37.18,2.89
  rectangle: 39.02,-2.89 39.72,-2.19
  rectangle: 39.02,-0.35 39.72,0.35
  rectangle: 39.02,2.19 39.72,2.89
  rectangle: 41.56,-2.89 42.26,-2.19
  rectangle: 41.56,-0.35 42.26,0.35
  rectangle: 41.56,2.19 42.26,2.89
  rectangle: 44.1,-2.89 44.8,-2.19
  rectangle: 44.1,-0.35 44.8,0.35
  rectangle: 44.1,2.19 44.8,2.89
  rectangle: 46.64,-2.89 47.34,-2.19
  rectangle: 46.64,-0.35 47.34,0.35
  rectangle: 46.64,2.19 47.34,2.89
  rectangle: 49.18,-2.89 49.88,-2.19
  rectangle: 49.18,-0.35 49.88,0.35
  rectangle: 49.18,2.19 49.88,2.89
  rectangle: 51.72,-2.89 52.42,-2.19
  rectangle: 51.72,-0.35 52.42,0.35
  rectangle: 51.72,2.19 52.42,2.89
  rectangle: 54.26,-2.89 54.96,-2.19
  rectangle: 54.26,-0.35 54.96,0.35
  rectangle: 54.26,2.19 54.96,2.89
  rectangle: 56.8,-2.89 57.5,-2.19
  rectangle: 56.8,-0.35 57.5,0.35
  rectangle: 56.8,2.19 57.5,2.89
  rectangle: 59.34,-2.89 60.04,-2.19
  rectangle: 59.34,-0.35 60.04,0.35
  rectangle: 59.34,2.19 60.04,2.89

## TSW-148-02-S-T-RA [mil]
pads (144):
  oct 59.06x59.06 hole 39.37: 1(2350,60) 2(2350,160) 3(2350,260) 4(2250,60) 5(2250,160) 6(2250,260) 7(2150,60) 8(2150,160) 9(2150,260) 10(2050,60) 11(2050,160) 12(2050,260) 13(1950,60) 14(1950,160) 15(1950,260) 16(1850,60) 17(1850,160) 18(1850,260) 19(1750,60) 20(1750,160) 21(1750,260) 22(1650,60) 23(1650,160) 24(1650,260) 25(1550,60) 26(1550,160) 27(1550,260) 28(1450,60) 29(1450,160) 30(1450,260) 31(1350,60) 32(1350,160) 33(1350,260) 34(1250,60) 35(1250,160) 36(1250,260) 37(1150,60) 38(1150,160) 39(1150,260) 40(1050,60) 41(1050,160) 42(1050,260) 43(950,60) 44(950,160) 45(950,260) 46(850,60) 47(850,160) 48(850,260) 49(750,60) 50(750,160) 51(750,260) 52(650,60) 53(650,160) 54(650,260) 55(550,60) 56(550,160) 57(550,260) 58(450,60) 59(450,160) 60(450,260) 61(350,60) 62(350,160) 63(350,260) 64(250,60) 65(250,160) 66(250,260) 67(150,60) 68(150,160) 69(150,260) 70(50,60) 71(50,160) 72(50,260) 73(-50,60) 74(-50,160) 75(-50,260) 76(-150,60) 77(-150,160) 78(-150,260) 79(-250,60) 80(-250,160) 81(-250,260) 82(-350,60) 83(-350,160) 84(-350,260) 85(-450,60) 86(-450,160) 87(-450,260) 88(-550,60) 89(-550,160) 90(-550,260) 91(-650,60) 92(-650,160) 93(-650,260) 94(-750,60) 95(-750,160) 96(-750,260) 97(-850,60) 98(-850,160) 99(-850,260) 100(-950,60) 101(-950,160) 102(-950,260) 103(-1050,60) 104(-1050,160) 105(-1050,260) 106(-1150,60) 107(-1150,160) 108(-1150,260) 109(-1250,60) 110(-1250,160) 111(-1250,260) 112(-1350,60) 113(-1350,160) 114(-1350,260) 115(-1450,60) 116(-1450,160) 117(-1450,260) 118(-1550,60) 119(-1550,160) 120(-1550,260) 121(-1650,60) 122(-1650,160) 123(-1650,260) 124(-1750,60) 125(-1750,160) 126(-1750,260) 127(-1850,60) 128(-1850,160) 129(-1850,260) 130(-1950,60) 131(-1950,160) 132(-1950,260) 133(-2050,60) 134(-2050,160) 135(-2050,260) 136(-2150,60) 137(-2150,160) 138(-2150,260) 139(-2250,60) 140(-2250,160) 141(-2250,260) 142(-2350,60) 143(-2350,160) 144(-2350,260)
Top Overlay:
  rectangle: -2360,-310.63 -2340,-80.32
  rectangle: -2260,-310.63 -2240,-80.32
  rectangle: -2160,-310.63 -2140,-80.32
  rectangle: -2060,-310.63 -2040,-80.32
  rectangle: -1960,-310.63 -1940,-80.32
  rectangle: -1860,-310.63 -1840,-80.32
  rectangle: -1760,-310.63 -1740,-80.32
  rectangle: -1660,-310.63 -1640,-80.32
  rectangle: -1560,-310.63 -1540,-80.32
  rectangle: -1460,-310.63 -1440,-80.32
  rectangle: -1360,-310.63 -1340,-80.32
  rectangle: -1260,-310.63 -1240,-80.32
  rectangle: -1160,-310.63 -1140,-80.32
  rectangle: -1060,-310.63 -1040,-80.32
  rectangle: -960,-310.63 -940,-80.32
  rectangle: -860,-310.63 -840,-80.32
  rectangle: -760,-310.63 -740,-80.32
  rectangle: -660,-310.63 -640,-80.32
  rectangle: -560,-310.63 -540,-80.32
  rectangle: -460,-310.63 -440,-80.32
  rectangle: -360,-310.63 -340,-80.32
  rectangle: -260,-310.63 -240,-80.32
  rectangle: -160,-310.63 -140,-80.32
  rectangle: -60,-310.63 -40,-80.32
  rectangle: 40,-310.63 60,-80.32
  rectangle: 140,-310.63 160,-80.32
  rectangle: 240,-310.63 260,-80.32
  rectangle: 340,-310.63 360,-80.32
  rectangle: 440,-310.63 460,-80.32
  rectangle: 540,-310.63 560,-80.32
  rectangle: 640,-310.63 660,-80.32
  rectangle: 740,-310.63 760,-80.32
  rectangle: 840,-310.63 860,-80.32
  rectangle: 940,-310.63 960,-80.32
  rectangle: 1040,-310.63 1060,-80.32
  rectangle: 1140,-310.63 1160,-80.32
  rectangle: 1240,-310.63 1260,-80.32
  rectangle: 1340,-310.63 1360,-80.32
  rectangle: 1440,-310.63 1460,-80.32
  rectangle: 1540,-310.63 1560,-80.32
  rectangle: 1640,-310.63 1660,-80.32
  rectangle: 1740,-310.63 1760,-80.32
  rectangle: 1840,-310.63 1860,-80.32
  rectangle: 1940,-310.63 1960,-80.32
  rectangle: 2040,-310.63 2060,-80.32
  rectangle: 2140,-310.63 2160,-80.32
  rectangle: 2240,-310.63 2260,-80.32
  rectangle: 2340,-310.63 2360,-80.32
  lines w8: -2405.08,-80.55 2405.08,-80.55 2405.08,-4.17 -2405.08,-4.17 -2405.08,-80.55
  text "1" at 2401.57,41.34 h36.81
  text "3" at 2402.17,236.81 h36.81
Mechanical 16:
  rectangle: -2360,0 -2340,270
  rectangle: -2260,0 -2240,270
  rectangle: -2160,0 -2140,270
  rectangle: -2060,0 -2040,270
  rectangle: -1960,0 -1940,270
  rectangle: -1860,0 -1840,270
  rectangle: -1760,0 -1740,270
  rectangle: -1660,0 -1640,270
  rectangle: -1560,0 -1540,270
  rectangle: -1460,0 -1440,270
  rectangle: -1360,0 -1340,270
  rectangle: -1260,0 -1240,270
  rectangle: -1160,0 -1140,270
  rectangle: -1060,0 -1040,270
  rectangle: -960,0 -940,270
  rectangle: -860,0 -840,270
  rectangle: -760,0 -740,270
  rectangle: -660,0 -640,270
  rectangle: -560,0 -540,270
  rectangle: -460,0 -440,270
  rectangle: -360,0 -340,270
  rectangle: -260,0 -240,270
  rectangle: -160,0 -140,270
  rectangle: -60,0 -40,270
  rectangle: 40,0 60,270
  rectangle: 140,0 160,270
  rectangle: 240,0 260,270
  rectangle: 340,0 360,270
  rectangle: 440,0 460,270
  rectangle: 540,0 560,270
  rectangle: 640,0 660,270
  rectangle: 740,0 760,270
  rectangle: 840,0 860,270
  rectangle: 940,0 960,270
  rectangle: 1040,0 1060,270
  rectangle: 1140,0 1160,270
  rectangle: 1240,0 1260,270
  rectangle: 1340,0 1360,270
  rectangle: 1440,0 1460,270
  rectangle: 1540,0 1560,270
  rectangle: 1640,0 1660,270
  rectangle: 1740,0 1760,270
  rectangle: 1840,0 1860,270
  rectangle: 1940,0 1960,270
  rectangle: 2040,0 2060,270
  rectangle: 2140,0 2160,270
  rectangle: 2240,0 2260,270
  rectangle: 2340,0 2360,270

## TSW-149-02-S-D [mm]
pads (98):
  oct 1.5x1.5 hole 1: 1(60.96,-1.27) 2(60.96,1.27) 3(58.42,-1.27) 4(58.42,1.27) 5(55.88,-1.27) 6(55.88,1.27) 7(53.34,-1.27) 8(53.34,1.27) 9(50.8,-1.27) 10(50.8,1.27) 11(48.26,-1.27) 12(48.26,1.27) 13(45.72,-1.27) 14(45.72,1.27) 15(43.18,-1.27) 16(43.18,1.27) 17(40.64,-1.27) 18(40.64,1.27) 19(38.1,-1.27) 20(38.1,1.27) 21(35.56,-1.27) 22(35.56,1.27) 23(33.02,-1.27) 24(33.02,1.27) 25(30.48,-1.27) 26(30.48,1.27) 27(27.94,-1.27) 28(27.94,1.27) 29(25.4,-1.27) 30(25.4,1.27) 31(22.86,-1.27) 32(22.86,1.27) 33(20.32,-1.27) 34(20.32,1.27) 35(17.78,-1.27) 36(17.78,1.27) 37(15.24,-1.27) 38(15.24,1.27) 39(12.7,-1.27) 40(12.7,1.27) 41(10.16,-1.27) 42(10.16,1.27) 43(7.62,-1.27) 44(7.62,1.27) 45(5.08,-1.27) 46(5.08,1.27) 47(2.54,-1.27) 48(2.54,1.27) 49(0,-1.27) 50(0,1.27) 51(-2.54,-1.27) 52(-2.54,1.27) 53(-5.08,-1.27) 54(-5.08,1.27) 55(-7.62,-1.27) 56(-7.62,1.27) 57(-10.16,-1.27) 58(-10.16,1.27) 59(-12.7,-1.27) 60(-12.7,1.27) 61(-15.24,-1.27) 62(-15.24,1.27) 63(-17.78,-1.27) 64(-17.78,1.27) 65(-20.32,-1.27) 66(-20.32,1.27) 67(-22.86,-1.27) 68(-22.86,1.27) 69(-25.4,-1.27) 70(-25.4,1.27) 71(-27.94,-1.27) 72(-27.94,1.27) 73(-30.48,-1.27) 74(-30.48,1.27) 75(-33.02,-1.27) 76(-33.02,1.27) 77(-35.56,-1.27) 78(-35.56,1.27) 79(-38.1,-1.27) 80(-38.1,1.27) 81(-40.64,-1.27) 82(-40.64,1.27) 83(-43.18,-1.27) 84(-43.18,1.27) 85(-45.72,-1.27) 86(-45.72,1.27) 87(-48.26,-1.27) 88(-48.26,1.27) 89(-50.8,-1.27) 90(-50.8,1.27) 91(-53.34,-1.27) 92(-53.34,1.27) 93(-55.88,-1.27) 94(-55.88,1.27) 95(-58.42,-1.27) 96(-58.42,1.27) 97(-60.96,-1.27) 98(-60.96,1.27)
Top Overlay:
  lines w0.203: -62.359,-2.425 62.359,-2.425 62.359,2.425 -62.359,2.425 -62.359,-2.425
  text "1" at 60.752,-3.818 h0.94
  text "2" at 60.577,2.744 h0.94
Mechanical 16:
  rectangle: -63.85,-1.62 -63.15,-0.92
  rectangle: -63.85,0.92 -63.15,1.62
  rectangle: -61.31,-1.62 -60.61,-0.92
  rectangle: -61.31,0.92 -60.61,1.62
  rectangle: -58.77,-1.62 -58.07,-0.92
  rectangle: -58.77,0.92 -58.07,1.62
  rectangle: -56.23,-1.62 -55.53,-0.92
  rectangle: -56.23,0.92 -55.53,1.62
  rectangle: -53.69,-1.62 -52.99,-0.92
  rectangle: -53.69,0.92 -52.99,1.62
  rectangle: -51.15,-1.62 -50.45,-0.92
  rectangle: -51.15,0.92 -50.45,1.62
  rectangle: -48.61,-1.62 -47.91,-0.92
  rectangle: -48.61,0.92 -47.91,1.62
  rectangle: -46.07,-1.62 -45.37,-0.92
  rectangle: -46.07,0.92 -45.37,1.62
  rectangle: -43.53,-1.62 -42.83,-0.92
  rectangle: -43.53,0.92 -42.83,1.62
  rectangle: -40.99,-1.62 -40.29,-0.92
  rectangle: -40.99,0.92 -40.29,1.62
  rectangle: -38.45,-1.62 -37.75,-0.92
  rectangle: -38.45,0.92 -37.75,1.62
  rectangle: -35.91,-1.62 -35.21,-0.92
  rectangle: -35.91,0.92 -35.21,1.62
  rectangle: -33.37,-1.62 -32.67,-0.92
  rectangle: -33.37,0.92 -32.67,1.62
  rectangle: -30.83,-1.62 -30.13,-0.92
  rectangle: -30.83,0.92 -30.13,1.62
  rectangle: -28.29,-1.62 -27.59,-0.92
  rectangle: -28.29,0.92 -27.59,1.62
  rectangle: -25.75,-1.62 -25.05,-0.92
  rectangle: -25.75,0.92 -25.05,1.62
  rectangle: -23.21,-1.62 -22.51,-0.92
  rectangle: -23.21,0.92 -22.51,1.62
  rectangle: -20.67,-1.62 -19.97,-0.92
  rectangle: -20.67,0.92 -19.97,1.62
  rectangle: -18.13,-1.62 -17.43,-0.92
  rectangle: -18.13,0.92 -17.43,1.62
  rectangle: -15.59,-1.62 -14.89,-0.92
  rectangle: -15.59,0.92 -14.89,1.62
  rectangle: -13.05,-1.62 -12.35,-0.92
  rectangle: -13.05,0.92 -12.35,1.62
  rectangle: -10.51,-1.62 -9.81,-0.92
  rectangle: -10.51,0.92 -9.81,1.62
  rectangle: -7.97,-1.62 -7.27,-0.92
  rectangle: -7.97,0.92 -7.27,1.62
  rectangle: -5.43,-1.62 -4.73,-0.92
  rectangle: -5.43,0.92 -4.73,1.62
  rectangle: -2.89,-1.62 -2.19,-0.92
  rectangle: -2.89,0.92 -2.19,1.62
  rectangle: -0.35,-1.62 0.35,-0.92
  rectangle: -0.35,0.92 0.35,1.62
  rectangle: 2.19,-1.62 2.89,-0.92
  rectangle: 2.19,0.92 2.89,1.62
  rectangle: 4.73,-1.62 5.43,-0.92
  rectangle: 4.73,0.92 5.43,1.62
  rectangle: 7.27,-1.62 7.97,-0.92
  rectangle: 7.27,0.92 7.97,1.62
  rectangle: 9.81,-1.62 10.51,-0.92
  rectangle: 9.81,0.92 10.51,1.62
  rectangle: 12.35,-1.62 13.05,-0.92
  rectangle: 12.35,0.92 13.05,1.62
  rectangle: 14.89,-1.62 15.59,-0.92
  rectangle: 14.89,0.92 15.59,1.62
  rectangle: 17.43,-1.62 18.13,-0.92
  rectangle: 17.43,0.92 18.13,1.62
  rectangle: 19.97,-1.62 20.67,-0.92
  rectangle: 19.97,0.92 20.67,1.62
  rectangle: 22.51,-1.62 23.21,-0.92
  rectangle: 22.51,0.92 23.21,1.62
  rectangle: 25.05,-1.62 25.75,-0.92
  rectangle: 25.05,0.92 25.75,1.62
  rectangle: 27.59,-1.62 28.29,-0.92
  rectangle: 27.59,0.92 28.29,1.62
  rectangle: 30.13,-1.62 30.83,-0.92
  rectangle: 30.13,0.92 30.83,1.62
  rectangle: 32.67,-1.62 33.37,-0.92
  rectangle: 32.67,0.92 33.37,1.62
  rectangle: 35.21,-1.62 35.91,-0.92
  rectangle: 35.21,0.92 35.91,1.62
  rectangle: 37.75,-1.62 38.45,-0.92
  rectangle: 37.75,0.92 38.45,1.62
  rectangle: 40.29,-1.62 40.99,-0.92
  rectangle: 40.29,0.92 40.99,1.62
  rectangle: 42.83,-1.62 43.53,-0.92
  rectangle: 42.83,0.92 43.53,1.62
  rectangle: 45.37,-1.62 46.07,-0.92
  rectangle: 45.37,0.92 46.07,1.62
  rectangle: 47.91,-1.62 48.61,-0.92
  rectangle: 47.91,0.92 48.61,1.62
  rectangle: 50.45,-1.62 51.15,-0.92
  rectangle: 50.45,0.92 51.15,1.62
  rectangle: 52.99,-1.62 53.69,-0.92
  rectangle: 52.99,0.92 53.69,1.62
  rectangle: 55.53,-1.62 56.23,-0.92
  rectangle: 55.53,0.92 56.23,1.62
  rectangle: 58.07,-1.62 58.77,-0.92
  rectangle: 58.07,0.92 58.77,1.62
  rectangle: 60.61,-1.62 61.31,-0.92
  rectangle: 60.61,0.92 61.31,1.62

## TSW-149-02-S-D-RA [mil]
pads (98):
  oct 59.06x59.06 hole 39.37: 1(2400,60) 2(2400,160) 3(2300,60) 4(2300,160) 5(2200,60) 6(2200,160) 7(2100,60) 8(2100,160) 9(2000,60) 10(2000,160) 11(1900,60) 12(1900,160) 13(1800,60) 14(1800,160) 15(1700,60) 16(1700,160) 17(1600,60) 18(1600,160) 19(1500,60) 20(1500,160) 21(1400,60) 22(1400,160) 23(1300,60) 24(1300,160) 25(1200,60) 26(1200,160) 27(1100,60) 28(1100,160) 29(1000,60) 30(1000,160) 31(900,60) 32(900,160) 33(800,60) 34(800,160) 35(700,60) 36(700,160) 37(600,60) 38(600,160) 39(500,60) 40(500,160) 41(400,60) 42(400,160) 43(300,60) 44(300,160) 45(200,60) 46(200,160) 47(100,60) 48(100,160) 49(0,60) 50(0,160) 51(-100,60) 52(-100,160) 53(-200,60) 54(-200,160) 55(-300,60) 56(-300,160) 57(-400,60) 58(-400,160) 59(-500,60) 60(-500,160) 61(-600,60) 62(-600,160) 63(-700,60) 64(-700,160) 65(-800,60) 66(-800,160) 67(-900,60) 68(-900,160) 69(-1000,60) 70(-1000,160) 71(-1100,60) 72(-1100,160) 73(-1200,60) 74(-1200,160) 75(-1300,60) 76(-1300,160) 77(-1400,60) 78(-1400,160) 79(-1500,60) 80(-1500,160) 81(-1600,60) 82(-1600,160) 83(-1700,60) 84(-1700,160) 85(-1800,60) 86(-1800,160) 87(-1900,60) 88(-1900,160) 89(-2000,60) 90(-2000,160) 91(-2100,60) 92(-2100,160) 93(-2200,60) 94(-2200,160) 95(-2300,60) 96(-2300,160) 97(-2400,60) 98(-2400,160)
Top Overlay:
  rectangle: -2410,-310.63 -2390,-80.32
  rectangle: -2310,-310.63 -2290,-80.32
  rectangle: -2210,-310.63 -2190,-80.32
  rectangle: -2110,-310.63 -2090,-80.32
  rectangle: -2010,-310.63 -1990,-80.32
  rectangle: -1910,-310.63 -1890,-80.32
  rectangle: -1810,-310.63 -1790,-80.32
  rectangle: -1710,-310.63 -1690,-80.32
  rectangle: -1610,-310.63 -1590,-80.32
  rectangle: -1510,-310.63 -1490,-80.32
  rectangle: -1410,-310.63 -1390,-80.32
  rectangle: -1310,-310.63 -1290,-80.32
  rectangle: -1210,-310.63 -1190,-80.32
  rectangle: -1110,-310.63 -1090,-80.32
  rectangle: -1010,-310.63 -990,-80.32
  rectangle: -910,-310.63 -890,-80.32
  rectangle: -810,-310.63 -790,-80.32
  rectangle: -710,-310.63 -690,-80.32
  rectangle: -610,-310.63 -590,-80.32
  rectangle: -510,-310.63 -490,-80.32
  rectangle: -410,-310.63 -390,-80.32
  rectangle: -310,-310.63 -290,-80.32
  rectangle: -210,-310.63 -190,-80.32
  rectangle: -110,-310.63 -90,-80.32
  rectangle: -10,-310.63 10,-80.32
  rectangle: 90,-310.63 110,-80.32
  rectangle: 190,-310.63 210,-80.32
  rectangle: 290,-310.63 310,-80.32
  rectangle: 390,-310.63 410,-80.32
  rectangle: 490,-310.63 510,-80.32
  rectangle: 590,-310.63 610,-80.32
  rectangle: 690,-310.63 710,-80.32
  rectangle: 790,-310.63 810,-80.32
  rectangle: 890,-310.63 910,-80.32
  rectangle: 990,-310.63 1010,-80.32
  rectangle: 1090,-310.63 1110,-80.32
  rectangle: 1190,-310.63 1210,-80.32
  rectangle: 1290,-310.63 1310,-80.32
  rectangle: 1390,-310.63 1410,-80.32
  rectangle: 1490,-310.63 1510,-80.32
  rectangle: 1590,-310.63 1610,-80.32
  rectangle: 1690,-310.63 1710,-80.32
  rectangle: 1790,-310.63 1810,-80.32
  rectangle: 1890,-310.63 1910,-80.32
  rectangle: 1990,-310.63 2010,-80.32
  rectangle: 2090,-310.63 2110,-80.32
  rectangle: 2190,-310.63 2210,-80.32
  rectangle: 2290,-310.63 2310,-80.32
  rectangle: 2390,-310.63 2410,-80.32
  lines w8: -2455.08,-80.55 2455.08,-80.55 2455.08,-4.17 -2455.08,-4.17 -2455.08,-80.55
  text "1" at 2450.59,30.51 h36.81
  text "2" at 2449.21,129.53 h36.81
Mechanical 16:
  rectangle: -2410,0 -2390,170
  rectangle: -2310,0 -2290,170
  rectangle: -2210,0 -2190,170
  rectangle: -2110,0 -2090,170
  rectangle: -2010,0 -1990,170
  rectangle: -1910,0 -1890,170
  rectangle: -1810,0 -1790,170
  rectangle: -1710,0 -1690,170
  rectangle: -1610,0 -1590,170
  rectangle: -1510,0 -1490,170
  rectangle: -1410,0 -1390,170
  rectangle: -1310,0 -1290,170
  rectangle: -1210,0 -1190,170
  rectangle: -1110,0 -1090,170
  rectangle: -1010,0 -990,170
  rectangle: -910,0 -890,170
  rectangle: -810,0 -790,170
  rectangle: -710,0 -690,170
  rectangle: -610,0 -590,170
  rectangle: -510,0 -490,170
  rectangle: -410,0 -390,170
  rectangle: -310,0 -290,170
  rectangle: -210,0 -190,170
  rectangle: -110,0 -90,170
  rectangle: -10,0 10,170
  rectangle: 90,0 110,170
  rectangle: 190,0 210,170
  rectangle: 290,0 310,170
  rectangle: 390,0 410,170
  rectangle: 490,0 510,170
  rectangle: 590,0 610,170
  rectangle: 690,0 710,170
  rectangle: 790,0 810,170
  rectangle: 890,0 910,170
  rectangle: 990,0 1010,170
  rectangle: 1090,0 1110,170
  rectangle: 1190,0 1210,170
  rectangle: 1290,0 1310,170
  rectangle: 1390,0 1410,170
  rectangle: 1490,0 1510,170
  rectangle: 1590,0 1610,170
  rectangle: 1690,0 1710,170
  rectangle: 1790,0 1810,170
  rectangle: 1890,0 1910,170
  rectangle: 1990,0 2010,170
  rectangle: 2090,0 2110,170
  rectangle: 2190,0 2210,170
  rectangle: 2290,0 2310,170
  rectangle: 2390,0 2410,170